# Altium footprint library MOLEX 1.25 连接器.PcbLib: 18 footprints (part 1 of 2)
Each footprint in its own frame and in the unit in brackets; x right, y up, seen from the top. Pads: shape width x height; smd on the part's side, far side on the other; paste and mask are expansions set on the pad; w line width, h text height; cw(c..) or ccw(c..) is an arc to the next point about the centre after c.
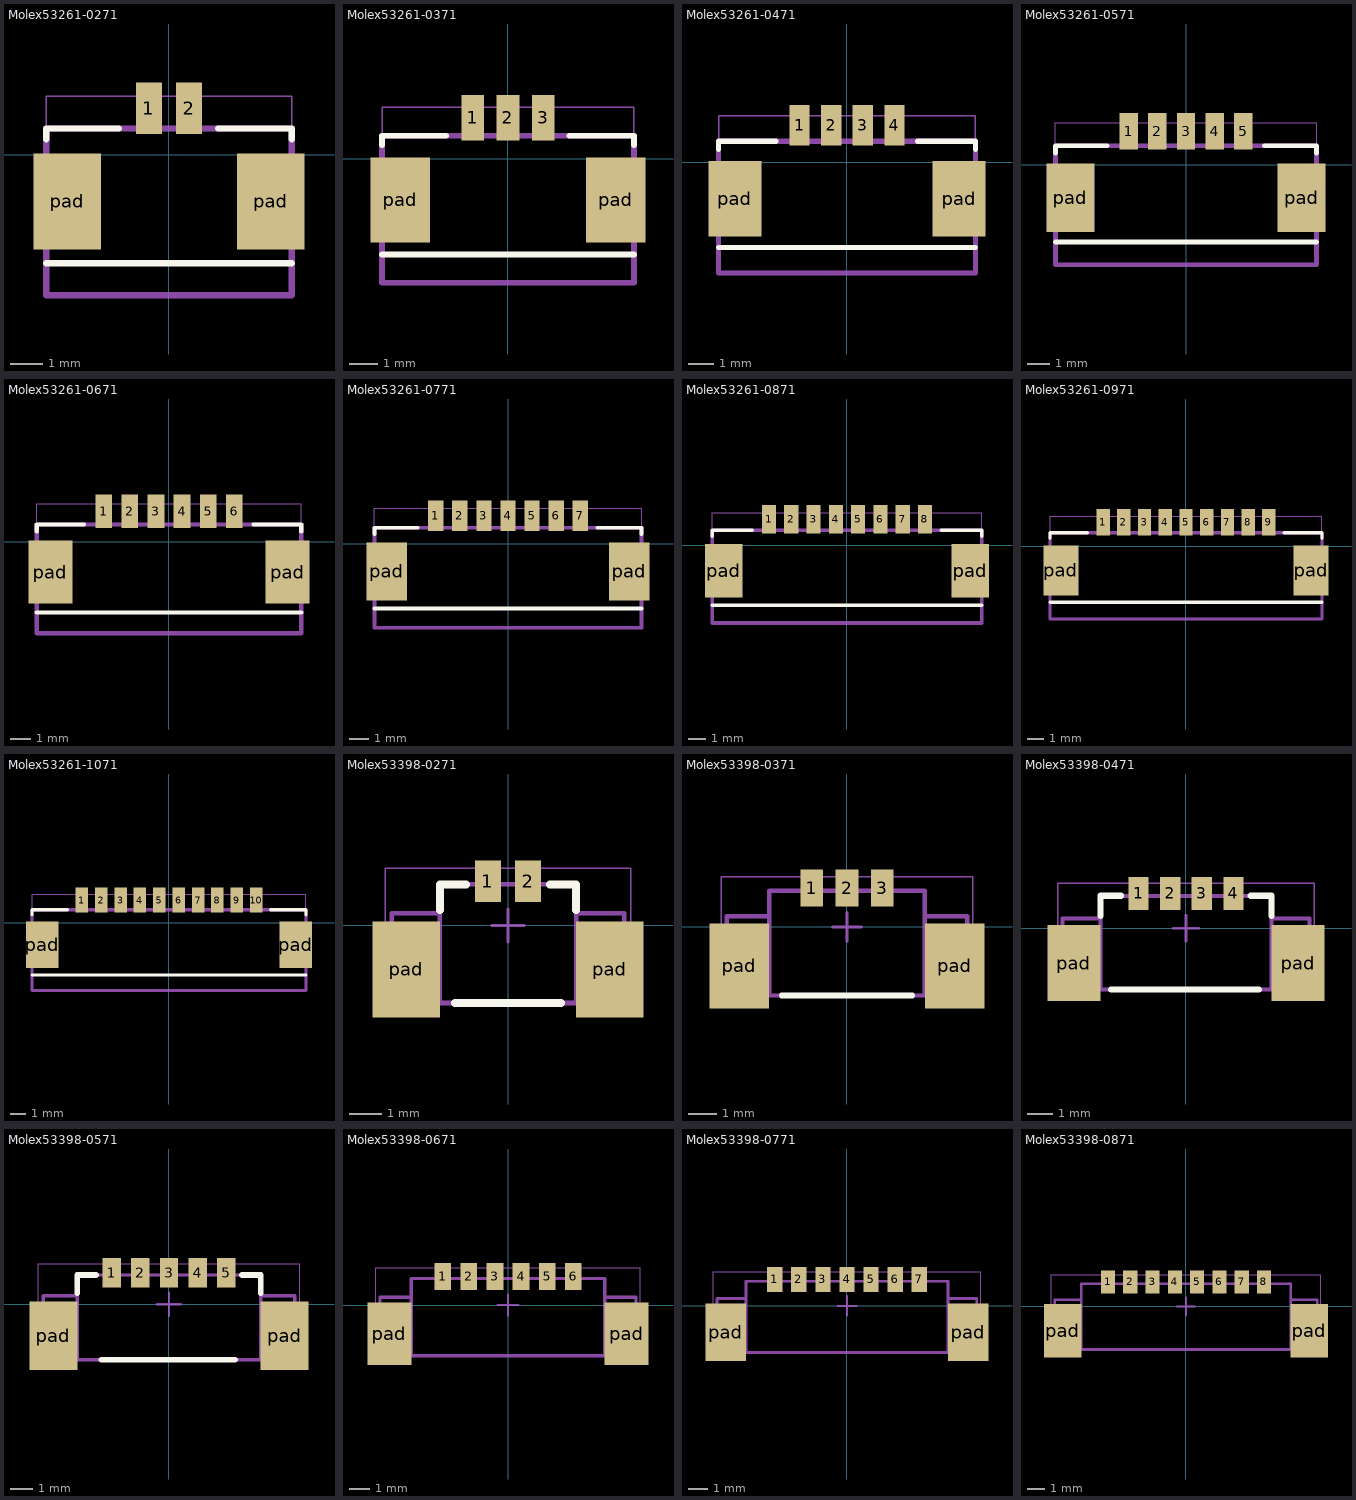
[diagram p0: the footprints below, top view; thin cyan lines are the x and y axes]

## Molex53261-0271 [mm] "molex 连接器"
height 3.4
pads (4):
  rect 0.8x1.6 smd: 1(-0.625,1.45) 2(0.625,1.45)
  rect 2.1x3 smd: pad(-3.175,-1.45) pad(3.175,-1.45)
Top Overlay:
  lines w0.2: -3.825,-3.378 3.825,-3.378 ; -3.825,0.492 -3.825,0.822 -1.564,0.822 ; 1.534,0.822 3.825,0.822 3.825,0.492
Mechanical 13:
  lines w0.05: -3.825,-3.378 3.825,-3.378 3.825,1.822 -3.825,1.822 -3.825,-3.378
Mechanical 15:
  lines w0.2: -3.825,-4.378 3.825,-4.378 3.825,0.822 -3.825,0.822 -3.825,-4.378
3D body: height 3.41, standoff 0.01, extent -3.825,-3.378 3.825,1.822

## Molex53261-0371 [mm] "molex 连接器"
height 3.4
pads (5):
  rect 0.8x1.6 smd: 1(-1.25,1.45) 2(0,1.45) 3(1.25,1.45)
  rect 2.1x3 smd: pad(-3.8,-1.45) pad(3.8,-1.45)
Top Overlay:
  lines w0.2: -4.45,-3.378 4.45,-3.378 ; -4.45,0.492 -4.45,0.822 -2.189,0.822 ; 2.159,0.822 4.45,0.822 4.45,0.492
Mechanical 13:
  lines w0.05: -4.45,-3.378 -4.45,1.822 4.45,1.822 4.45,-3.378 -4.45,-3.378
Mechanical 15:
  lines w0.2: -4.45,-4.378 -4.45,0.822 4.45,0.822 4.45,-4.378 -4.45,-4.378
3D body: height 3.41, standoff 0.01, extent -4.45,-3.378 4.45,1.822

## Molex53261-0471 [mm] "molex 连接器"
height 3.4
pads (6):
  rect 0.8x1.6 smd: 1(-1.875,1.45) 2(-0.625,1.45) 3(0.625,1.45) 4(1.875,1.45)
  rect 2.1x3 smd: pad(-4.425,-1.45) pad(4.425,-1.45)
Top Overlay:
  lines w0.2: -5.075,-3.378 5.075,-3.378 ; -5.075,0.492 -5.075,0.822 -2.814,0.822 ; 2.784,0.822 5.075,0.822 5.075,0.492
Mechanical 13:
  lines w0.05: -5.075,-3.378 5.075,-3.378 5.075,1.822 -5.075,1.822 -5.075,-3.378
Mechanical 15:
  lines w0.2: -5.075,-3.378 5.075,-3.378 ; -5.075,-4.378 5.075,-4.378 5.075,0.822 -5.075,0.822 -5.075,-4.378
3D body: height 3.41, standoff 0.01, extent -5.075,-3.378 5.075,1.822

## Molex53261-0571 [mm] "molex 连接器"
height 3.4
pads (7):
  rect 0.8x1.6 smd: 1(-2.5,1.45) 2(-1.25,1.45) 3(0,1.45) 4(1.25,1.45) 5(2.5,1.45)
  rect 2.1x3 smd: pad(-5.05,-1.45) pad(5.05,-1.45)
Top Overlay:
  lines w0.2: -5.7,-3.378 5.7,-3.378 ; -5.7,0.492 -5.7,0.822 -3.439,0.822 ; 3.409,0.822 5.7,0.822 5.7,0.492
Mechanical 13:
  lines w0.05: -5.7,-3.378 -5.7,1.822 5.7,1.822 5.7,-3.378 -5.7,-3.378
Mechanical 15:
  lines w0.2: -5.7,-4.378 5.7,-4.378 5.7,0.822 -5.7,0.822 -5.7,-4.378
3D body: height 3.41, standoff 0.01, extent -5.7,-3.378 5.7,1.822

## Molex53261-0671 [mm] "molex 连接器"
height 3.4
pads (8):
  rect 0.8x1.6 smd: 1(-3.125,1.45) 2(-1.875,1.45) 3(-0.625,1.45) 4(0.625,1.45) 5(1.875,1.45) 6(3.125,1.45)
  rect 2.1x3 smd: pad(-5.675,-1.45) pad(5.675,-1.45)
Top Overlay:
  lines w0.2: -6.325,-3.378 6.325,-3.378 ; -6.325,0.492 -6.325,0.822 -4.064,0.822 ; 4.034,0.822 6.325,0.822 6.325,0.492
Mechanical 13:
  lines w0.05: -6.325,-3.378 -6.325,1.822 6.325,1.822 6.325,-3.378 -6.325,-3.378
Mechanical 15:
  lines w0.2: -6.325,-4.378 -6.325,0.822 6.325,0.822 6.325,-4.378 -6.325,-4.378
3D body: height 3.41, standoff 0.01, extent -6.325,-3.378 6.325,1.822

## Molex53261-0771 [mm] "molex 连接器"
height 3.4
pads (9):
  rect 0.8x1.6 smd: 1(-3.75,1.45) 2(-2.5,1.45) 3(-1.25,1.45) 4(0,1.45) 5(1.25,1.45) 6(2.5,1.45) 7(3.75,1.45)
  rect 2.1x3 smd: pad(-6.3,-1.45) pad(6.3,-1.45)
Top Overlay:
  lines w0.2: -6.95,-3.378 6.95,-3.378 ; -6.95,0.492 -6.95,0.822 -4.689,0.822 ; 4.659,0.822 6.95,0.822 6.95,0.492
Mechanical 13:
  lines w0.05: -6.95,-3.378 -6.95,1.822 6.95,1.822 6.95,-3.378 -6.95,-3.378
Mechanical 15:
  lines w0.2: -6.95,-4.378 6.95,-4.378 6.95,0.822 -6.95,0.822 -6.95,-4.378
3D body: height 3.41, standoff 0.01, extent -6.95,-3.378 6.95,1.822

## Molex53261-0871 [mm] "molex 连接器"
height 3.4
pads (10):
  rect 0.8x1.6 smd: 1(-4.375,1.45) 2(-3.125,1.45) 3(-1.875,1.45) 4(-0.625,1.45) 5(0.625,1.45) 6(1.875,1.45) 7(3.125,1.45) 8(4.375,1.45)
  rect 2.1x3 smd: pad(-6.925,-1.45) pad(6.925,-1.45)
Top Overlay:
  lines w0.2: -7.575,-3.378 7.575,-3.378 ; -7.575,0.492 -7.575,0.822 -5.314,0.822 ; 5.284,0.822 7.575,0.822 7.575,0.492
Mechanical 13:
  lines w0.05: -7.575,-3.378 -7.575,1.822 7.575,1.822 7.575,-3.378 -7.575,-3.378
Mechanical 15:
  lines w0.2: -7.575,-4.378 -7.575,0.822 7.575,0.822 7.575,-4.378 -7.575,-4.378
3D body: height 3.41, standoff 0.01, extent -7.575,-3.378 7.575,1.822

## Molex53261-0971 [mm] "molex 连接器"
height 3.4
pads (11):
  rect 0.8x1.6 smd: 1(-5,1.45) 2(-3.75,1.45) 3(-2.5,1.45) 4(-1.25,1.45) 5(0,1.45) 6(1.25,1.45) 7(2.5,1.45) 8(3.75,1.45) 9(5,1.45)
  rect 2.1x3 smd: pad(-7.55,-1.45) pad(7.55,-1.45)
Top Overlay:
  lines w0.2: -8.2,-3.378 8.2,-3.378 ; -8.2,0.492 -8.2,0.822 -5.939,0.822 ; 5.909,0.822 8.2,0.822 8.2,0.492
Mechanical 13:
  lines w0.05: -8.2,-3.378 8.2,-3.378 8.2,1.822 -8.2,1.822 -8.2,-3.378
Mechanical 15:
  lines w0.2: -8.2,-4.378 -8.2,0.822 8.2,0.822 8.2,-4.378 -8.2,-4.378
3D body: height 3.41, standoff 0.01, extent -8.2,-3.378 8.2,1.822

## Molex53261-1071 [mm] "molex 连接器"
height 3.4
pads (12):
  rect 0.8x1.6 smd: 1(-5.625,1.45) 2(-4.375,1.45) 3(-3.125,1.45) 4(-1.875,1.45) 5(-0.625,1.45) 6(0.625,1.45) 7(1.875,1.45) 8(3.125,1.45) 9(4.375,1.45) 10(5.625,1.45)
  rect 2.1x3 smd: pad(-8.175,-1.45) pad(8.175,-1.45)
Top Overlay:
  lines w0.2: -8.825,-3.378 8.825,-3.378 ; -8.825,0.492 -8.825,0.822 -6.564,0.822 ; 6.534,0.822 8.825,0.822 8.825,0.492
Mechanical 13:
  lines w0.05: -8.825,-3.378 8.825,-3.378 8.825,1.822 -8.825,1.822 -8.825,-3.378
Mechanical 15:
  lines w0.2: -8.825,-4.378 8.825,-4.378 8.825,0.822 -8.825,0.822 -8.825,-4.378
3D body: height 3.41, standoff 0.01, extent -8.825,-3.378 8.825,1.822

## Molex53398-0271 [mm] "Molex53398 连接器"
height 5.7
pads (4):
  rect 0.8x1.3 smd: 1(-0.625,1.375) 2(0.625,1.375)
  rect 2.1x3 smd: pad(-3.175,-1.375) pad(3.175,-1.375)
Top Overlay:
  lines w0.25: -2.125,0.483 -2.125,1.279 -1.312,1.279 ; -1.651,-2.421 1.659,-2.421 ; 1.312,1.279 2.125,1.279 2.125,0.483
Mechanical 13:
  lines w0.05: -3.825,-2.421 3.825,-2.421 3.825,1.779 -3.825,1.779 -3.825,-2.421
Mechanical 15:
  lines w0.1: -0.508,0 0,0 ; 0,-0.508 0,0 ; 0,0.508 0,0 ; 0.508,0 0,0
  lines w0.15: -3.621,-0.221 -3.825,-0.425 -3.825,-2.221 -3.625,-2.421 ; -2.125,-2.421 -2.125,1.279 2.125,1.279 2.125,-2.421 ; -2.125,0.379 -3.625,0.379 -3.625,-2.421 ; 2.125,0.379 3.625,0.379 3.625,-2.421 ; 3.621,-0.221 3.825,-0.425 3.825,-2.221 3.625,-2.421 ; -3.625,-2.421 3.625,-2.421
3D body: height 4.71, standoff 0.01, extent -3.825,-2.421 3.825,1.779

## Molex53398-0371 [mm] "Molex53398 连接器"
height 5.7
pads (5):
  rect 0.8x1.3 smd: 1(-1.25,1.375) 2(0,1.375) 3(1.25,1.375)
  rect 2.1x3 smd: pad(-3.8,-1.375) pad(3.8,-1.375)
Top Overlay:
  lines w0.2: -2.3,-2.421 2.3,-2.421
Mechanical 13:
  lines w0.05: -4.45,-2.421 -4.45,1.779 4.45,1.779 4.45,-2.421 -4.45,-2.421
Mechanical 15:
  lines w0.1: -0.508,0 0,0 ; 0,-0.508 0,0 ; 0,0.508 0,0 ; 0.508,0 0,0
  lines w0.15: -4.246,-0.221 -4.45,-0.425 -4.45,-2.221 -4.25,-2.421 ; -2.75,-2.421 -2.75,1.279 2.75,1.279 2.75,-2.421 ; -2.75,0.379 -4.25,0.379 -4.25,-2.421 ; 2.75,0.379 4.25,0.379 4.25,-2.421 ; 4.246,-0.221 4.45,-0.425 4.45,-2.221 4.25,-2.421 ; -4.25,-2.421 4.25,-2.421
3D body: height 4.71, standoff 0.01, extent -4.45,-2.421 4.45,1.779

## Molex53398-0471 [mm] "Molex53398 连接器"
height 5.7
pads (6):
  rect 0.8x1.3 smd: 1(-1.875,1.375) 2(-0.625,1.375) 3(0.625,1.375) 4(1.875,1.375)
  rect 2.1x3 smd: pad(-4.425,-1.375) pad(4.425,-1.375)
Top Overlay:
  lines w0.25: -3.378,0.483 -3.378,1.279 -2.565,1.279 ; -2.946,-2.421 2.878,-2.421 ; 2.562,1.279 3.375,1.279 3.375,0.483
Mechanical 13:
  lines w0.05: -5.075,-2.421 -5.075,1.779 5.075,1.779 5.075,-2.421 -5.075,-2.421
Mechanical 15:
  lines w0.1: -0.508,0 0,0 ; 0,-0.508 0,0 ; 0,0.508 0,0 ; 0.508,0 0,0
  lines w0.15: -4.871,-0.221 -5.075,-0.425 -5.075,-2.221 -4.875,-2.421 ; -3.375,-2.421 -3.375,1.279 3.375,1.279 3.375,-2.421 ; -3.375,0.379 -4.875,0.379 -4.875,-2.421 ; 3.375,0.379 4.875,0.379 4.875,-2.421 ; 4.871,-0.221 5.075,-0.425 5.075,-2.221 4.875,-2.421 ; -4.875,-2.421 4.875,-2.421
3D body: height 4.71, standoff 0.01, extent -5.075,-2.421 5.075,1.779

## Molex53398-0571 [mm] "Molex53398 连接器"
height 5.7
pads (7):
  rect 0.8x1.3 smd: 1(-2.5,1.375) 2(-1.25,1.375) 3(0,1.375) 4(1.25,1.375) 5(2.5,1.375)
  rect 2.1x3 smd: pad(-5.05,-1.375) pad(5.05,-1.375)
Top Overlay:
  lines w0.25: -4.003,0.483 -4.003,1.279 -3.19,1.279 ; -2.946,-2.421 2.878,-2.421 ; 3.19,1.279 4.003,1.279 4.003,0.483
Mechanical 13:
  lines w0.05: -5.7,-2.421 -5.7,1.779 5.7,1.779 5.7,-2.421 -5.7,-2.421
Mechanical 15:
  lines w0.1: -0.508,0 0,0 ; 0,-0.508 0,0 ; 0,0.508 0,0 ; 0.508,0 0,0
  lines w0.15: -5.496,-0.221 -5.7,-0.425 -5.7,-2.221 -5.5,-2.421 ; -4,-2.421 -4,1.279 4,1.279 4,-2.421 ; -4,0.379 -5.5,0.379 -5.5,-2.421 ; 4,0.379 5.5,0.379 5.5,-2.421 ; 5.496,-0.221 5.7,-0.425 5.7,-2.221 5.5,-2.421 ; -5.5,-2.421 5.5,-2.421
3D body: height 4.71, standoff 0.01, extent -5.7,-2.421 5.7,1.779

## Molex53398-0671 [mm] "Molex53398 连接器"
height 5.7
pads (8):
  rect 0.8x1.3 smd: 1(-3.125,1.375) 2(-1.875,1.375) 3(-0.625,1.375) 4(0.625,1.375) 5(1.875,1.375) 6(3.125,1.375)
  rect 2.1x3 smd: pad(-5.675,-1.375) pad(5.675,-1.375)
Mechanical 13:
  lines w0.05: -6.325,-2.421 6.325,-2.421 6.325,1.779 -6.325,1.779 -6.325,-2.421
Mechanical 15:
  lines w0.1: -0.508,0 0,0 ; 0,-0.508 0,0 ; 0,0.508 0,0 ; 0.508,0 0,0
  lines w0.15: -6.121,-0.221 -6.325,-0.425 -6.325,-2.221 -6.125,-2.421 ; -4.625,-2.421 -4.625,1.279 4.625,1.279 4.625,-2.421 ; -4.625,0.379 -6.125,0.379 -6.125,-2.421 ; 4.625,0.379 6.125,0.379 6.125,-2.421 ; 6.121,-0.221 6.325,-0.425 6.325,-2.221 6.125,-2.421 ; -6.125,-2.421 6.125,-2.421
3D body: height 4.71, standoff 0.01, extent -6.325,-2.421 6.325,1.779

## Molex53398-0771 [mm] "Molex53398 连接器"
height 5.7
pads (9):
  rect 0.8x1.3 smd: 1(-3.75,1.375) 2(-2.5,1.375) 3(-1.25,1.375) 4(0,1.375) 5(1.25,1.375) 6(2.5,1.375) 7(3.75,1.375)
  rect 2.1x3 smd: pad(-6.3,-1.375) pad(6.3,-1.375)
Mechanical 13:
  lines w0.05: -6.95,-2.421 -6.95,1.779 6.95,1.779 6.95,-2.421 -6.95,-2.421
Mechanical 15:
  lines w0.1: -0.508,0 0,0 ; 0,-0.508 0,0 ; 0,0.508 0,0 ; 0.508,0 0,0
  lines w0.15: -6.746,-0.221 -6.95,-0.425 -6.95,-2.221 -6.75,-2.421 ; -5.25,-2.421 -5.25,1.279 5.25,1.279 5.25,-2.421 ; -5.25,0.379 -6.75,0.379 -6.75,-2.421 ; 5.25,0.379 6.75,0.379 6.75,-2.421 ; 6.746,-0.221 6.95,-0.425 6.95,-2.221 6.75,-2.421 ; -6.75,-2.421 6.75,-2.421
3D body: height 4.71, standoff 0.01, extent -6.95,-2.421 6.95,1.779

## Molex53398-0871 [mm] "Molex53398 连接器"
height 5.7
pads (10):
  rect 0.8x1.3 smd: 1(-4.375,1.375) 2(-3.125,1.375) 3(-1.875,1.375) 4(-0.625,1.375) 5(0.625,1.375) 6(1.875,1.375) 7(3.125,1.375) 8(4.375,1.375)
  rect 2.1x3 smd: pad(-6.925,-1.375) pad(6.925,-1.375)
Mechanical 13:
  lines w0.05: -7.575,-2.421 -7.575,1.779 7.575,1.779 7.575,-2.421 -7.575,-2.421
Mechanical 15:
  lines w0.1: -0.508,0 0,0 ; 0,-0.508 0,0 ; 0,0.508 0,0 ; 0.508,0 0,0
  lines w0.15: -7.371,-0.221 -7.575,-0.425 -7.575,-2.221 -7.375,-2.421 ; -5.875,-2.421 -5.875,1.279 5.875,1.279 5.875,-2.421 ; -5.875,0.379 -7.375,0.379 -7.375,-2.421 ; 5.875,0.379 7.375,0.379 7.375,-2.421 ; 7.371,-0.221 7.575,-0.425 7.575,-2.221 7.375,-2.421 ; -7.375,-2.421 7.375,-2.421
3D body: height 4.71, standoff 0.01, extent -7.575,-2.421 7.575,1.779